# Altium footprint library SAMTEC SMD.PcbLib: 165 footprints (part 10 of 17)
Each footprint in its own frame and in the unit in brackets; x right, y up, seen from the top. Pads: shape width x height; smd on the part's side, far side on the other; paste and mask are expansions set on the pad; w line width, h text height; cw(c..) or ccw(c..) is an arc to the next point about the centre after c.
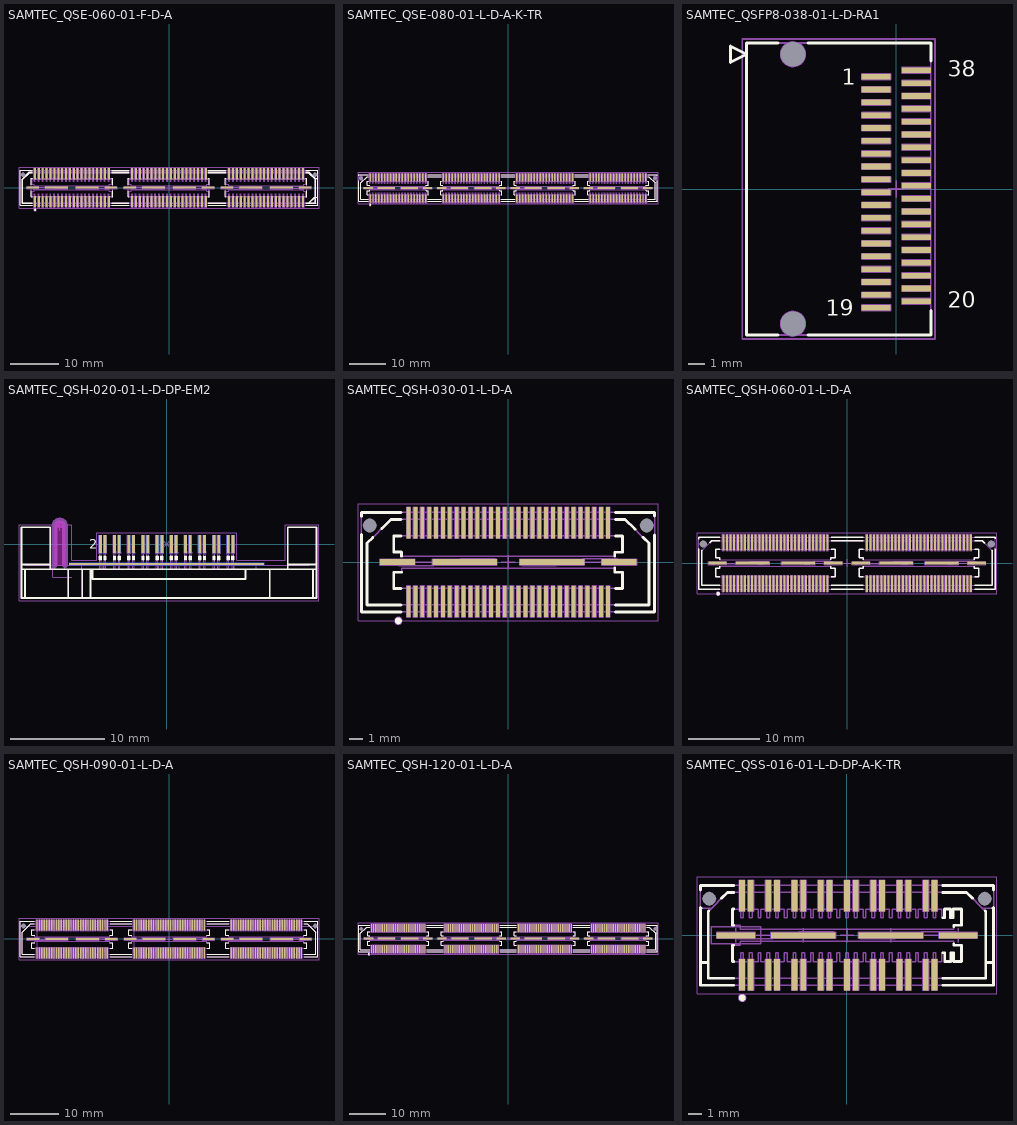
[diagram p9: the footprints below, top view; thin cyan lines are the x and y axes]

## SAMTEC_QSE-060-01-F-D-A [mm] "120 Contacts Female, Pitch 0.8mm, Straight Double Row High Speed Ground Plane Socket"
height 3.25
pads (134):
  rect 0.406x2.273 smd mask+0: 1(-27.6,-2.865) 2(-27.6,2.865) 3(-26.8,-2.865) 4(-26.8,2.865) 5(-26,-2.865) 6(-26,2.865) 7(-25.2,-2.865) 8(-25.2,2.865) 9(-24.4,-2.865) 10(-24.4,2.865) 11(-23.6,-2.865) 12(-23.6,2.865) 13(-22.8,-2.865) 14(-22.8,2.865) 15(-22,-2.865) 16(-22,2.865) 17(-21.2,-2.865) 18(-21.2,2.865) 19(-20.4,-2.865) 20(-20.4,2.865) 21(-19.6,-2.865) 22(-19.6,2.865) 23(-18.8,-2.865) 24(-18.8,2.865) 25(-18,-2.865) 26(-18,2.865) 27(-17.2,-2.865) 28(-17.2,2.865) 29(-16.4,-2.865) 30(-16.4,2.865) 31(-15.6,-2.865) 32(-15.6,2.865) 33(-14.8,-2.865) 34(-14.8,2.865) 35(-14,-2.865) 36(-14,2.865) 37(-13.2,-2.865) 38(-13.2,2.865) 39(-12.4,-2.865) 40(-12.4,2.865) 41(-7.6,-2.865) 42(-7.6,2.865) 43(-6.8,-2.865) 44(-6.8,2.865) 45(-6,-2.865) 46(-6,2.865) 47(-5.2,-2.865) 48(-5.2,2.865) 49(-4.4,-2.865) 50(-4.4,2.865) 51(-3.6,-2.865) 52(-3.6,2.865) 53(-2.8,-2.865) 54(-2.8,2.865) 55(-2,-2.865) 56(-2,2.865) 57(-1.2,-2.865) 58(-1.2,2.865) 59(-0.4,-2.865) 60(-0.4,2.865) 61(0.4,-2.865) 62(0.4,2.865) 63(1.2,-2.865) 64(1.2,2.865) 65(2,-2.865) 66(2,2.865) 67(2.8,-2.865) 68(2.8,2.865) 69(3.6,-2.865) 70(3.6,2.865) 71(4.4,-2.865) 72(4.4,2.865) 73(5.2,-2.865) 74(5.2,2.865) 75(6,-2.865) 76(6,2.865) 77(6.8,-2.865) 78(6.8,2.865) 79(7.6,-2.865) 80(7.6,2.865) 81(12.4,-2.865) 82(12.4,2.865) 83(13.2,-2.865) 84(13.2,2.865) 85(14,-2.865) 86(14,2.865) 87(14.8,-2.865) 88(14.8,2.865) 89(15.6,-2.865) 90(15.6,2.865) 91(16.4,-2.865) 92(16.4,2.865) 93(17.2,-2.865) 94(17.2,2.865) 95(18,-2.865) 96(18,2.865) 97(18.8,-2.865) 98(18.8,2.865) 99(19.6,-2.865) 100(19.6,2.865) 101(20.4,-2.865) 102(20.4,2.865) 103(21.2,-2.865) 104(21.2,2.865) 105(22,-2.865) 106(22,2.865) 107(22.8,-2.865) 108(22.8,2.865) 109(23.6,-2.865) 110(23.6,2.865) 111(24.4,-2.865) 112(24.4,2.865) 113(25.2,-2.865) 114(25.2,2.865) 115(26,-2.865) 116(26,2.865) 117(26.8,-2.865) 118(26.8,2.865) 119(27.6,-2.865) 120(27.6,2.865)
  rect 2.54x0.43 smd mask+0: 121(-28.065,0) 124(-11.935,0) 125(-8.065,0) 128(8.065,0) 129(11.935,0) 132(28.065,0)
  rect 4.699x0.432 smd mask+0: 122(-23.175,0) 123(-16.825,0) 126(-3.175,0) 127(3.175,0) 130(16.825,0) 131(23.175,0)
  round 0.5 hole 1 unplated mask+0.25: 133(-30.065,2.665) 134(30.065,2.665)
Top Overlay:
  circle w0.25: c-27.575,-4.55 r0.125
  lines w0.2: -28.321,-0.615 -28.321,-1.905 -28.205,-1.905 ; -28.321,0.615 -28.321,1.905 -28.205,1.905 ; -28.205,-3.62 -30.639,-3.62 -30.639,3.62 -28.205,3.62 ; -28.205,-3.258 -30.227,-3.258 ; -28.205,-3.112 -30.08,-3.112 ; -28.205,3.112 -28.683,3.112 ; -28.205,3.258 -28.744,3.258 ; -11.795,-3.62 -8.28,-3.62 ; -11.795,-3.258 -8.28,-3.258 ; -11.795,-3.112 -8.28,-3.112 ; -11.795,-1.905 -11.607,-1.905 -11.607,-0.615 ; -11.795,1.905 -11.607,1.905 -11.607,0.615 ; -11.795,3.112 -8.28,3.112 ; -11.795,3.258 -8.28,3.258 ; -11.795,3.62 -8.28,3.62 ; -8.396,-0.615 -8.396,-1.905 -8.28,-1.905 ; -8.396,0.615 -8.396,1.905 -8.28,1.905 ; 8.13,-3.62 11.723,-3.62 ; 8.13,-3.258 11.723,-3.258 ; 8.13,-3.112 11.723,-3.112 ; 8.13,-1.905 8.319,-1.905 8.319,-0.615 ; 8.13,1.905 8.319,1.905 8.319,0.615 ; 8.13,3.112 11.723,3.112 ; 8.13,3.258 11.723,3.258 ; 8.13,3.62 11.723,3.62 ; 11.607,-0.615 11.607,-1.905 11.723,-1.905 ; 11.607,0.615 11.607,1.905 11.723,1.905 ; 28.133,-3.62 30.639,-3.62 ; 28.133,-3.258 30.227,-3.258 ; 28.133,-3.112 30.08,-3.112 ; 28.133,-1.905 28.321,-1.905 ; 28.133,1.905 28.321,1.905 ; 28.133,3.112 28.683,3.112 ; 28.133,3.258 28.744,3.258 ; 28.133,3.62 30.639,3.62 ; 28.22,-3.62 30.639,-3.62 ; 28.22,-3.258 28.794,-3.258 ; 28.22,-3.112 28.734,-3.112 ; 28.22,-1.905 28.321,-1.905 ; 28.22,1.905 28.321,1.905 ; 28.22,3.112 28.734,3.112 ; 28.22,3.258 28.794,3.258 ; 28.22,3.62 30.639,3.62 ; 28.321,0.615 28.321,1.905 ; 28.321,0.617 28.321,1.905 ; 29.877,1.968 30.639,1.968 ; 30.084,-1.968 28.794,-3.258 ; 30.084,1.968 28.794,3.258 ; 30.131,-1.968 30.131,1.714 28.734,3.112 ; 30.639,-1.968 29.877,-1.968 28.734,-3.112 ; -30.227,-3.258 -30.227,1.775 ; -30.227,-3.258 -30.08,-3.112 ; -30.227,1.775 -30.08,1.714 ; -30.227,1.775 -28.744,3.258 ; -30.08,-3.112 -30.08,1.714 ; -30.08,1.714 -28.683,3.112 ; -28.744,3.258 -28.683,3.112 ; 28.321,-1.905 28.321,-0.614 28.321,-1.905 ; 28.683,3.112 30.08,1.714 ; 28.683,3.112 28.744,3.258 ; 28.734,-3.112 28.794,-3.258 ; 28.734,3.112 28.794,3.258 ; 28.744,3.258 30.227,1.775 ; 30.08,-3.112 30.08,1.714 ; 30.08,-3.112 30.227,-3.258 ; 30.08,1.714 30.227,1.775 ; 30.227,-3.258 30.227,1.775 ; 30.639,-3.62 30.639,3.62 ; 30.639,-3.62 30.639,3.62
Mechanical 8:
  drawing of 805 lines, arcs and shapes, not listed
Mechanical 14:
  drawing of 870 lines, arcs and shapes, not listed
Mechanical 15:
  lines w0.05: -30.889,-4.25 -30.889,4.25 30.889,4.25 30.889,-4.25 -30.889,-4.25
3D body "SAMTEC_QSE-060-01-F-D-A.stp": height 3.25, standoff -0.75, extent -30.639,-3.746 30.639,3.747

## SAMTEC_QSE-080-01-L-D-A-K-TR [mm] "160 Contacts Female, Pitch 0.8mm, Straight Double Row High Speed Ground Plane Socket"
height 3.25
pads (178):
  rect 0.406x2.273 smd mask+0: 1(-37.6,-2.865) 2(-37.6,2.865) 3(-36.8,-2.865) 4(-36.8,2.865) 5(-36,-2.865) 6(-36,2.865) 7(-35.2,-2.865) 8(-35.2,2.865) 9(-34.4,-2.865) 10(-34.4,2.865) 11(-33.6,-2.865) 12(-33.6,2.865) 13(-32.8,-2.865) 14(-32.8,2.865) 15(-32,-2.865) 16(-32,2.865) 17(-31.2,-2.865) 18(-31.2,2.865) 19(-30.4,-2.865) 20(-30.4,2.865) 21(-29.6,-2.865) 22(-29.6,2.865) 23(-28.8,-2.865) 24(-28.8,2.865) 25(-28,-2.865) 26(-28,2.865) 27(-27.2,-2.865) 28(-27.2,2.865) 29(-26.4,-2.865) 30(-26.4,2.865) 31(-25.6,-2.865) 32(-25.6,2.865) 33(-24.8,-2.865) 34(-24.8,2.865) 35(-24,-2.865) 36(-24,2.865) 37(-23.2,-2.865) 38(-23.2,2.865) 39(-22.4,-2.865) 40(-22.4,2.865) 41(-17.6,-2.865) 42(-17.6,2.865) 43(-16.8,-2.865) 44(-16.8,2.865) 45(-16,-2.865) 46(-16,2.865) 47(-15.2,-2.865) 48(-15.2,2.865) 49(-14.4,-2.865) 50(-14.4,2.865) 51(-13.6,-2.865) 52(-13.6,2.865) 53(-12.8,-2.865) 54(-12.8,2.865) 55(-12,-2.865) 56(-12,2.865) 57(-11.2,-2.865) 58(-11.2,2.865) 59(-10.4,-2.865) 60(-10.4,2.865) 61(-9.6,-2.865) 62(-9.6,2.865) 63(-8.8,-2.865) 64(-8.8,2.865) 65(-8,-2.865) 66(-8,2.865) 67(-7.2,-2.865) 68(-7.2,2.865) 69(-6.4,-2.865) 70(-6.4,2.865) 71(-5.6,-2.865) 72(-5.6,2.865) 73(-4.8,-2.865) 74(-4.8,2.865) 75(-4,-2.865) 76(-4,2.865) 77(-3.2,-2.865) 78(-3.2,2.865) 79(-2.4,-2.865) 80(-2.4,2.865) 81(2.4,-2.865) 82(2.4,2.865) 83(3.2,-2.865) 84(3.2,2.865) 85(4,-2.865) 86(4,2.865) 87(4.8,-2.865) 88(4.8,2.865) 89(5.6,-2.865) 90(5.6,2.865) 91(6.4,-2.865) 92(6.4,2.865) 93(7.2,-2.865) 94(7.2,2.865) 95(8,-2.865) 96(8,2.865) 97(8.8,-2.865) 98(8.8,2.865) 99(9.6,-2.865) 100(9.6,2.865) 101(10.4,-2.865) 102(10.4,2.865) 103(11.2,-2.865) 104(11.2,2.865) 105(12,-2.865) 106(12,2.865) 107(12.8,-2.865) 108(12.8,2.865) 109(13.6,-2.865) 110(13.6,2.865) 111(14.4,-2.865) 112(14.4,2.865) 113(15.2,-2.865) 114(15.2,2.865) 115(16,-2.865) 116(16,2.865) 117(16.8,-2.865) 118(16.8,2.865) 119(17.6,-2.865) 120(17.6,2.865) 121(22.4,-2.865) 122(22.4,2.865) 123(23.2,-2.865) 124(23.2,2.865) 125(24,-2.865) 126(24,2.865) 127(24.8,-2.865) 128(24.8,2.865) 129(25.6,-2.865) 130(25.6,2.865) 131(26.4,-2.865) 132(26.4,2.865) 133(27.2,-2.865) 134(27.2,2.865) 135(28,-2.865) 136(28,2.865) 137(28.8,-2.865) 138(28.8,2.865) 139(29.6,-2.865) 140(29.6,2.865) 141(30.4,-2.865) 142(30.4,2.865) 143(31.2,-2.865) 144(31.2,2.865) 145(32,-2.865) 146(32,2.865) 147(32.8,-2.865) 148(32.8,2.865) 149(33.6,-2.865) 150(33.6,2.865) 151(34.4,-2.865) 152(34.4,2.865) 153(35.2,-2.865) 154(35.2,2.865) 155(36,-2.865) 156(36,2.865) 157(36.8,-2.865) 158(36.8,2.865) 159(37.6,-2.865) 160(37.6,2.865)
  rect 2.54x0.43 smd mask+0: 161(-38.065,0) 164(-21.935,0) 165(-18.065,0) 168(-1.935,0) 169(1.935,0) 172(18.065,0) 173(21.935,0) 176(38.065,0)
  rect 4.699x0.432 smd mask+0: 162(-33.195,0) 163(-26.845,0) 166(-13.195,0) 167(-6.845,0) 170(6.805,0) 171(13.155,0) 174(26.805,0) 175(33.155,0)
  round 0.5 hole 1 unplated mask+0.25: 177(-40.065,2.665) 178(40.065,2.665)
Top Overlay:
  circle w0.25: c-37.575,-4.55 r0.125
  lines w0.2: -40.64,1.973 -40.64,-3.62 -38.15,-3.62 ; -40.64,3.357 -40.64,3.62 -38.15,3.62 ; -38.15,-3.112 -40.081,-3.112 -40.081,1.383 -38.352,3.112 -38.15,3.112 ; -38.15,-1.905 -38.322,-1.905 -38.322,-0.73 -37.751,-0.73 -37.751,-0.565 ; -38.15,1.905 -38.322,1.905 -38.322,0.73 -37.751,0.73 -37.751,0.565 ; -22.257,-0.565 -22.257,-0.73 -21.685,-0.73 -21.685,-1.905 -21.85,-1.905 ; -22.257,0.565 -22.257,0.73 -21.685,0.73 -21.685,1.905 -21.85,1.905 ; -21.85,-3.62 -18.15,-3.62 ; -21.85,-3.112 -18.15,-3.112 ; -21.85,3.112 -18.15,3.112 ; -21.85,3.62 -18.15,3.62 ; -18.15,-1.905 -18.32,-1.905 -18.32,-0.73 -17.748,-0.73 -17.748,-0.565 ; -18.15,1.905 -18.32,1.905 -18.32,0.73 -17.748,0.73 -17.748,0.565 ; -2.254,-0.565 -2.254,-0.73 -1.683,-0.73 -1.683,-1.905 -1.85,-1.905 ; -2.254,0.565 -2.254,0.73 -1.683,0.73 -1.683,1.905 -1.85,1.905 ; -1.85,-3.62 1.85,-3.62 ; -1.85,-3.112 1.85,-3.112 ; -1.85,3.112 1.85,3.112 ; -1.85,3.62 1.85,3.62 ; 1.85,-1.905 1.683,-1.905 1.683,-0.73 2.254,-0.73 2.254,-0.565 ; 1.85,1.905 1.683,1.905 1.683,0.73 2.254,0.73 2.254,0.565 ; 17.748,-0.565 17.748,-0.73 18.32,-0.73 18.32,-1.905 18.15,-1.905 ; 17.748,0.565 17.748,0.73 18.32,0.73 18.32,1.905 18.15,1.905 ; 18.15,-3.62 21.85,-3.62 ; 18.15,-3.112 21.85,-3.112 ; 18.15,3.112 21.85,3.112 ; 18.15,3.62 21.85,3.62 ; 21.85,-1.905 21.685,-1.905 21.685,-0.73 22.257,-0.73 22.257,-0.565 ; 21.85,1.905 21.685,1.905 21.685,0.73 22.257,0.73 22.257,0.565 ; 37.751,-0.565 37.751,-0.73 38.322,-0.73 38.322,-1.905 38.15,-1.905 ; 37.751,0.565 37.751,0.73 38.322,0.73 38.322,1.905 38.15,1.905 ; 38.15,-3.62 40.64,-3.62 40.64,1.973 ; 38.15,-3.112 40.081,-3.112 40.081,1.383 38.352,3.112 38.15,3.112 ; 38.15,3.62 40.64,3.62 40.64,3.357
Mechanical 8:
  drawing of 1078 lines, arcs and shapes, not listed
Mechanical 14:
  drawing of 779 lines, arcs and shapes, not listed
Mechanical 15:
  lines w0.05: -40.89,-4.25 -40.89,4.25 40.89,4.25 40.89,-4.25 -40.89,-4.25
3D body "SAMTEC_QSE-080-01-L-D-A-K-TR.stp": height 3.25, standoff -0.75, extent -40.64,-3.746 40.64,3.747

## SAMTEC_QSFP8-038-01-L-D-RA1 [mm] "Dual Row 38 positions, Pitch 0.8mm, QSFP+ Right Angle Edge Connector"
height 5.35
pads (40):
  rect 1.8x0.35 smd: 1(-1.255,7) 2(-1.255,6.2) 3(-1.255,5.4) 4(-1.255,4.6) 5(-1.255,3.8) 6(-1.255,3) 7(-1.255,2.2) 8(-1.255,1.4) 9(-1.255,0.6) 10(-1.255,-0.2) 11(-1.255,-1) 12(-1.255,-1.8) 13(-1.255,-2.6) 14(-1.255,-3.4) 15(-1.255,-4.2) 16(-1.255,-5) 17(-1.255,-5.8) 18(-1.255,-6.6) 19(-1.255,-7.4) 20(1.255,-7) 21(1.255,-6.2) 22(1.255,-5.4) 23(1.255,-4.6) 24(1.255,-3.8) 25(1.255,-3) 26(1.255,-2.2) 27(1.255,-1.4) 28(1.255,-0.6) 29(1.255,0.2) 30(1.255,1) 31(1.255,1.8) 32(1.255,2.6) 33(1.255,3.4) 34(1.255,4.2) 35(1.255,5) 36(1.255,5.8) 37(1.255,6.6) 38(1.255,7.4)
  round 0.5 hole 1.55 unplated mask+0.525: MTG1(-6.435,8.4) MTG2(-6.435,-8.4)
Top Overlay:
  lines w0.2: -7.379,-9.1 -9.335,-9.1 -9.335,9.1 -7.379,9.1 ; -5.491,-9.1 2.165,-9.1 2.165,-7.575 ; -5.491,9.1 2.165,9.1 2.165,7.975 ; -10.335,7.9 -9.335,8.4 -10.335,8.9 -10.335,7.9
  text "38" at 3.2,7 h1
  text "20" at 3.2,-7.4 h1
  text "19" at -4.4,-7.9 h1
  text "1" at -3.4,6.5 h1
Mechanical 8:
  drawing of 242 lines, arcs and shapes, not listed
Mechanical 14:
  lines w0.1: -10.335,7.9 -9.335,8.4 -10.335,8.9 -10.335,7.9 ; -9.335,-9.1 -9.335,9.1 2.165,9.1 2.165,-9.1 -9.335,-9.1
  text "1" at -3.4,6.5 h1
  text "19" at -4.4,-7.9 h1
  text "20" at 3.2,-7.4 h1
  text "38" at 3.2,7 h1
Mechanical 15:
  lines w0.1: -9.585,-9.35 -9.585,9.35 2.415,9.35 2.415,-9.35 -9.585,-9.35
3D body "SAMTEC_QSFP8-038-01-L-D-RA1.stp": height 5.35, standoff -0.95, extent -9.335,-9.1 2.165,9.1

## SAMTEC_QSH-020-01-L-D-DP-EM2 [mm] "40 Contacts (20 Differential Pairs) + 2 Ground, Pitch 0.5mm, Right Angle (PCB Edge Mount), High Speed Ground Plane Socket"
height 7.24
pads (42):
  rect 0.3x1.91 smd far side paste-1 mask-1: 1(-7,0) 3(-6.5,0) 7(-5.5,0) 9(-5,0) 13(-4,0) 15(-3.5,0) 19(-2.5,0) 21(-2,0) 25(-1,0) 27(-0.5,0) 31(0.5,0) 33(1,0) 37(2,0) 39(2.5,0) 43(3.5,0) 45(4,0) 49(5,0) 51(5.5,0) 55(6.5,0) 57(7,0)
  rect 0.3x1.91 smd paste-1 mask-1: 2(-7,0) 4(-6.5,0) 8(-5.5,0) 10(-5,0) 14(-4,0) 16(-3.5,0) 20(-2.5,0) 22(-2,0) 26(-1,0) 28(-0.5,0) 32(0.5,0) 34(1,0) 38(2,0) 40(2.5,0) 44(3.5,0) 46(4,0) 50(5,0) 52(5.5,0) 56(6.5,0) 58(7,0)
  rect 20.574x0.254 smd far side paste-10.3: 59(0,-2.098)
  rect 20.574x0.254 smd paste-10.3: 60(0,-2.098)
Top Layer:
  region: -7.15,-0.955 -7.15,0.195 -7.064,0.195 -7.064,0.955 -6.937,0.955 -6.937,0.195 -6.85,0.195 -6.85,-0.955
  region: -6.65,-0.955 -6.65,0.195 -6.563,0.195 -6.563,0.955 -6.436,0.955 -6.436,0.195 -6.35,0.195 -6.35,-0.955
  region: -5.65,-0.955 -5.65,0.195 -5.563,0.195 -5.563,0.955 -5.436,0.955 -5.436,0.195 -5.35,0.195 -5.35,-0.955
  region: -5.15,-0.955 -5.15,0.195 -5.064,0.195 -5.064,0.955 -4.937,0.955 -4.937,0.195 -4.85,0.195 -4.85,-0.955
  region: -4.15,-0.955 -4.15,0.195 -4.063,0.195 -4.063,0.955 -3.936,0.955 -3.936,0.195 -3.85,0.195 -3.85,-0.955
  region: -3.65,-0.955 -3.65,0.195 -3.564,0.195 -3.564,0.955 -3.437,0.955 -3.437,0.195 -3.35,0.195 -3.35,-0.955
  region: -2.65,-0.955 -2.65,0.195 -2.564,0.195 -2.564,0.955 -2.437,0.955 -2.437,0.195 -2.35,0.195 -2.35,-0.955
  region: -2.15,-0.955 -2.15,0.195 -2.064,0.195 -2.064,0.955 -1.937,0.955 -1.937,0.195 -1.85,0.195 -1.85,-0.955
  region: -1.15,-0.955 -1.15,0.195 -1.064,0.195 -1.064,0.955 -0.937,0.955 -0.937,0.195 -0.85,0.195 -0.85,-0.955
  region: -0.65,-0.955 -0.65,0.195 -0.563,0.195 -0.563,0.955 -0.436,0.955 -0.436,0.195 -0.35,0.195 -0.35,-0.955
  region: 0.35,-0.955 0.35,0.195 0.436,0.195 0.436,0.955 0.563,0.955 0.563,0.195 0.65,0.195 0.65,-0.955
  region: 0.85,-0.955 0.85,0.195 0.937,0.195 0.937,0.955 1.064,0.955 1.064,0.195 1.15,0.195 1.15,-0.955
  region: 1.85,-0.955 1.85,0.195 1.937,0.195 1.937,0.955 2.064,0.955 2.064,0.195 2.15,0.195 2.15,-0.955
  region: 2.35,-0.955 2.35,0.195 2.437,0.195 2.437,0.955 2.564,0.955 2.564,0.195 2.65,0.195 2.65,-0.955
  region: 3.35,-0.955 3.35,0.195 3.437,0.195 3.437,0.955 3.564,0.955 3.564,0.195 3.65,0.195 3.65,-0.955
  region: 3.85,-0.955 3.85,0.195 3.936,0.195 3.936,0.955 4.063,0.955 4.063,0.195 4.15,0.195 4.15,-0.955
  region: 4.85,-0.955 4.85,0.195 4.937,0.195 4.937,0.955 5.064,0.955 5.064,0.195 5.15,0.195 5.15,-0.955
  region: 5.35,-0.955 5.35,0.195 5.436,0.195 5.436,0.955 5.563,0.955 5.563,0.195 5.65,0.195 5.65,-0.955
  region: 6.35,-0.955 6.35,0.195 6.436,0.195 6.436,0.955 6.563,0.955 6.563,0.195 6.65,0.195 6.65,-0.955
  region: 6.85,-0.955 6.85,0.195 6.937,0.195 6.937,0.955 7.064,0.955 7.064,0.195 7.15,0.195 7.15,-0.955
Bottom Layer:
  region: 6.85,-0.955 6.85,0.195 6.937,0.195 6.937,0.955 7.064,0.955 7.064,0.195 7.15,0.195 7.15,-0.955
  region: 6.35,-0.955 6.35,0.195 6.436,0.195 6.436,0.955 6.563,0.955 6.563,0.195 6.65,0.195 6.65,-0.955
  region: 5.35,-0.955 5.35,0.195 5.436,0.195 5.436,0.955 5.563,0.955 5.563,0.195 5.65,0.195 5.65,-0.955
  region: 4.85,-0.955 4.85,0.195 4.937,0.195 4.937,0.955 5.064,0.955 5.064,0.195 5.15,0.195 5.15,-0.955
  region: 3.85,-0.955 3.85,0.195 3.936,0.195 3.936,0.955 4.063,0.955 4.063,0.195 4.15,0.195 4.15,-0.955
  region: 3.35,-0.955 3.35,0.195 3.437,0.195 3.437,0.955 3.564,0.955 3.564,0.195 3.65,0.195 3.65,-0.955
  region: 2.35,-0.955 2.35,0.195 2.437,0.195 2.437,0.955 2.564,0.955 2.564,0.195 2.65,0.195 2.65,-0.955
  region: 1.85,-0.955 1.85,0.195 1.937,0.195 1.937,0.955 2.064,0.955 2.064,0.195 2.15,0.195 2.15,-0.955
  region: 0.85,-0.955 0.85,0.195 0.937,0.195 0.937,0.955 1.064,0.955 1.064,0.195 1.15,0.195 1.15,-0.955
  region: 0.35,-0.955 0.35,0.195 0.436,0.195 0.436,0.955 0.563,0.955 0.563,0.195 0.65,0.195 0.65,-0.955
  region: -0.65,-0.955 -0.65,0.195 -0.563,0.195 -0.563,0.955 -0.436,0.955 -0.436,0.195 -0.35,0.195 -0.35,-0.955
  region: -1.15,-0.955 -1.15,0.195 -1.064,0.195 -1.064,0.955 -0.937,0.955 -0.937,0.195 -0.85,0.195 -0.85,-0.955
  region: -2.15,-0.955 -2.15,0.195 -2.064,0.195 -2.064,0.955 -1.937,0.955 -1.937,0.195 -1.85,0.195 -1.85,-0.955
  region: -2.65,-0.955 -2.65,0.195 -2.564,0.195 -2.564,0.955 -2.437,0.955 -2.437,0.195 -2.35,0.195 -2.35,-0.955
  region: -3.65,-0.955 -3.65,0.195 -3.564,0.195 -3.564,0.955 -3.437,0.955 -3.437,0.195 -3.35,0.195 -3.35,-0.955
  region: -4.15,-0.955 -4.15,0.195 -4.063,0.195 -4.063,0.955 -3.936,0.955 -3.936,0.195 -3.85,0.195 -3.85,-0.955
  region: -5.15,-0.955 -5.15,0.195 -5.064,0.195 -5.064,0.955 -4.937,0.955 -4.937,0.195 -4.85,0.195 -4.85,-0.955
  region: -5.65,-0.955 -5.65,0.195 -5.563,0.195 -5.563,0.955 -5.436,0.955 -5.436,0.195 -5.35,0.195 -5.35,-0.955
  region: -6.65,-0.955 -6.65,0.195 -6.563,0.195 -6.563,0.955 -6.436,0.955 -6.436,0.195 -6.35,0.195 -6.35,-0.955
  region: -7.15,-0.955 -7.15,0.195 -7.064,0.195 -7.064,0.955 -6.937,0.955 -6.937,0.195 -6.85,0.195 -6.85,-0.955
Top Overlay:
  lines w0.2: -15.339,-2.657 15.839,-2.657 ; -15.339,-2.149 -12.291,-2.149 ; -14.958,-5.705 -14.958,-2.657 ; -12.291,-2.657 -12.291,1.788 -15.339,1.788 -15.339,-5.705 15.839,-5.705 15.839,1.788 12.791,1.788 12.791,-2.657 ; -10.386,-5.705 -10.386,-2.657 ; -8.913,-5.705 -8.913,-2.657 ; -8.024,-5.705 -8.024,-2.657 ; -7.846,-2.657 -7.846,-3.673 8.346,-3.673 8.346,-2.657 ; -7.078,-1.621 -7.078,-1.305 ; -6.926,-1.621 -6.926,-1.305 ; -6.578,-1.621 -6.578,-1.305 ; -6.425,-1.621 -6.425,-1.305 ; -5.578,-1.621 -5.578,-1.305 ; -5.426,-1.621 -5.426,-1.305 ; -5.078,-1.621 -5.078,-1.305 ; -4.925,-1.621 -4.925,-1.305 ; -4.078,-1.621 -4.078,-1.305 ; -3.926,-1.621 -3.926,-1.305 ; -3.578,-1.621 -3.578,-1.305 ; -3.425,-1.621 -3.425,-1.305 ; -2.578,-1.621 -2.578,-1.305 ; -2.426,-1.621 -2.426,-1.305 ; -2.078,-1.621 -2.078,-1.305 ; -1.925,-1.621 -1.925,-1.305 ; -1.078,-1.621 -1.078,-1.305 ; -0.926,-1.621 -0.926,-1.305 ; -0.578,-1.621 -0.578,-1.305 ; -0.425,-1.621 -0.425,-1.305 ; 0.422,-1.621 0.422,-1.305 ; 0.574,-1.621 0.574,-1.305 ; 0.922,-1.621 0.922,-1.305 ; 1.075,-1.621 1.075,-1.305 ; 1.922,-1.621 1.922,-1.305 ; 2.074,-1.621 2.074,-1.305 ; 2.422,-1.621 2.422,-1.305 ; 2.575,-1.621 2.575,-1.305 ; 3.422,-1.621 3.422,-1.305 ; 3.574,-1.621 3.574,-1.305 ; 3.922,-1.621 3.922,-1.305 ; 4.075,-1.621 4.075,-1.305 ; 4.922,-1.621 4.922,-1.305 ; 5.074,-1.621 5.074,-1.305 ; 5.422,-1.621 5.422,-1.305 ; 5.575,-1.621 5.575,-1.305 ; 6.422,-1.621 6.422,-1.305 ; 6.574,-1.621 6.574,-1.305 ; 6.922,-1.621 6.922,-1.305 ; 7.075,-1.621 7.075,-1.305 ; 10.886,-5.705 10.886,-2.657 ; 12.791,-2.149 15.839,-2.149 ; 15.458,-5.705 15.458,-2.657
  text "2" at -8.15,-0.5 h1
Bottom Overlay:
  circle w0.25: c-7,1.6 r0.125
  lines w0.2: -15.339,-2.657 15.839,-2.657 ; -12.291,-2.657 -12.291,1.788 -15.339,1.788 -15.339,-5.705 15.839,-5.705 15.839,1.788 12.791,1.788 12.791,-2.657 ; -10.386,-5.705 -10.386,-2.657 ; -8.913,-5.705 -8.913,-2.657 ; -8.024,-5.705 -8.024,-2.657 ; -7.846,-2.657 -7.846,-3.673 8.346,-3.673 8.346,-2.657 ; -7.078,-1.621 -7.078,-1.305 ; -6.926,-1.621 -6.926,-1.305 ; -6.578,-1.621 -6.578,-1.305 ; -6.425,-1.621 -6.425,-1.305 ; -5.578,-1.621 -5.578,-1.305 ; -5.426,-1.621 -5.426,-1.305 ; -5.078,-1.621 -5.078,-1.305 ; -4.925,-1.621 -4.925,-1.305 ; -4.078,-1.621 -4.078,-1.305 ; -3.926,-1.621 -3.926,-1.305 ; -3.578,-1.621 -3.578,-1.305 ; -3.425,-1.621 -3.425,-1.305 ; -2.578,-1.621 -2.578,-1.305 ; -2.426,-1.621 -2.426,-1.305 ; -2.078,-1.621 -2.078,-1.305 ; -1.925,-1.621 -1.925,-1.305 ; -1.078,-1.621 -1.078,-1.305 ; -0.926,-1.621 -0.926,-1.305 ; -0.578,-1.621 -0.578,-1.305 ; -0.425,-1.621 -0.425,-1.305 ; 0.422,-1.621 0.422,-1.305 ; 0.574,-1.621 0.574,-1.305 ; 0.922,-1.621 0.922,-1.305 ; 1.075,-1.621 1.075,-1.305 ; 1.922,-1.621 1.922,-1.305 ; 2.074,-1.621 2.074,-1.305 ; 2.422,-1.621 2.422,-1.305 ; 2.575,-1.621 2.575,-1.305 ; 3.422,-1.621 3.422,-1.305 ; 3.574,-1.621 3.574,-1.305 ; 3.922,-1.621 3.922,-1.305 ; 4.075,-1.621 4.075,-1.305 ; 4.922,-1.621 4.922,-1.305 ; 5.074,-1.621 5.074,-1.305 ; 5.422,-1.621 5.422,-1.305 ; 5.575,-1.621 5.575,-1.305 ; 6.422,-1.621 6.422,-1.305 ; 6.574,-1.621 6.574,-1.305 ; 6.922,-1.621 6.922,-1.305 ; 7.075,-1.621 7.075,-1.305 ; 10.886,-5.705 10.886,-2.657
  text "1" at -7.7,-0.5 h1
Keep-Out Layer:
  board cut-out: -11.83,-2.225 -10.73,-2.225 -10.73,1.925 -10.73,2.034 -10.814,2.237 -10.968,2.391 -11.171,2.475 -11.389,2.475 -11.592,2.391 -11.746,2.237 -11.83,2.034 -11.83,1.925
Mechanical 1:
  lines w0.635: -11.83,-2.225 -11.83,1.925 cw(c-11.28,1.925) -10.73,1.925 -10.73,-2.225
Mechanical 8:
  drawing of 294 lines, arcs and shapes, not listed
  text "Board Edge must be Plated" at -9.4,-4 h1
Mechanical 14:
  lines w0.1: -15.339,-2.657 15.839,-2.657 ; -15.339,-2.149 -12.291,-2.149 ; -14.958,-5.705 -14.958,-2.657 ; -12.291,-2.657 -12.291,1.788 -15.339,1.788 -15.339,-5.705 15.839,-5.705 15.839,1.788 12.791,1.788 12.791,-2.657 ; -11.783,-2.657 -11.783,1.407 cw(c-11.402,1.407) -11.402,1.788 -11.148,1.788 cw(c-11.148,1.407) -10.767,1.407 -10.767,-2.657 ; -10.386,-5.705 -10.386,-2.657 ; -8.964,-2.657 -8.964,-2.225 -7.078,-2.225 ; -8.913,-5.705 -8.913,-2.657 ; -8.024,-5.705 -8.024,-2.657 ; -7.846,-2.657 -7.846,-3.673 8.346,-3.673 8.346,-2.657 ; -7.078,-2.657 -7.078,0.34 -6.926,0.34 -6.926,-2.657 ; -6.926,-2.225 -6.678,-2.225 -6.678,-2.657 ; -6.578,-2.657 -6.578,0.34 -6.425,0.34 -6.425,-2.657 ; -5.578,-2.657 -5.578,0.34 -5.426,0.34 -5.426,-2.657 ; -5.078,-2.657 -5.078,0.34 -4.925,0.34 -4.925,-2.657 ; -4.925,-2.225 -4.078,-2.225 ; -4.078,-2.657 -4.078,0.34 -3.926,0.34 -3.926,-2.657 ; -3.926,-2.225 -3.578,-2.225 ; -3.578,-2.657 -3.578,0.34 -3.425,0.34 -3.425,-2.657 ; -3.425,-2.225 -2.578,-2.225 ; -2.578,-2.657 -2.578,0.34 -2.426,0.34 -2.426,-2.657 ; -2.426,-2.225 -2.078,-2.225 ; -2.078,-2.657 -2.078,0.34 -1.925,0.34 -1.925,-2.657 ; -1.925,-2.225 -1.078,-2.225 ; -1.078,-2.657 -1.078,0.34 -0.926,0.34 -0.926,-2.657 ; -0.926,-2.225 -0.836,-2.225 -0.836,-2.657 ; -0.578,-2.657 -0.578,0.34 -0.425,0.34 -0.425,-2.657 ; 0.422,-2.657 0.422,0.34 0.574,0.34 0.574,-2.657 ; 0.922,-2.657 0.922,0.34 1.075,0.34 1.075,-2.657 ; 1.323,-2.657 1.323,-2.225 1.922,-2.225 ; 1.922,-2.657 1.922,0.34 2.074,0.34 2.074,-2.657 ; 2.074,-2.225 2.422,-2.225 ; 2.422,-2.657 2.422,0.34 2.575,0.34 2.575,-2.657 ; 2.575,-2.225 3.422,-2.225 ; 3.422,-2.657 3.422,0.34 3.574,0.34 3.574,-2.657 ; 3.574,-2.225 3.922,-2.225 ; 3.922,-2.657 3.922,0.34 4.075,0.34 4.075,-2.657 ; 4.075,-2.225 4.922,-2.225 ; 4.922,-2.657 4.922,0.34 5.074,0.34 5.074,-2.657 ; 5.074,-2.225 5.422,-2.225 ; 5.422,-2.657 5.422,0.34 5.575,0.34 5.575,-2.657 ; 6.422,-2.657 6.422,0.34 6.574,0.34 6.574,-2.657 ; 6.922,-2.657 6.922,0.34 7.075,0.34 7.075,-2.657 ; 7.165,-2.657 7.165,-2.225 9.451,-2.225 9.451,-2.657 ; 10.886,-5.705 10.886,-2.657 ; 12.791,-2.149 15.839,-2.149 ; 15.458,-5.705 15.458,-2.657
Mechanical 15:
  lines w0.05: -15.589,-5.955 -15.589,2.038 -10.037,2.038 -10.037,-1.721 -7.4,-1.721 -7.4,1.205 7.4,1.205 7.4,-1.721 12.541,-1.721 12.541,2.038 16.089,2.038 16.089,-5.955 -15.589,-5.955
3D body "SAMTEC_QSH-020-01-L-D-DP-EM2.stp": height 2.82, standoff -4.42, extent -15.339,-5.705 15.839,1.788
